# Altium footprint library Footprints.PcbLib: 104 footprints (part 1 of 7)
Each footprint in its own frame and in the unit in brackets; x right, y up, seen from the top. Pads: shape width x height; smd on the part's side, far side on the other; paste and mask are expansions set on the pad; w line width, h text height; cw(c..) or ccw(c..) is an arc to the next point about the centre after c.
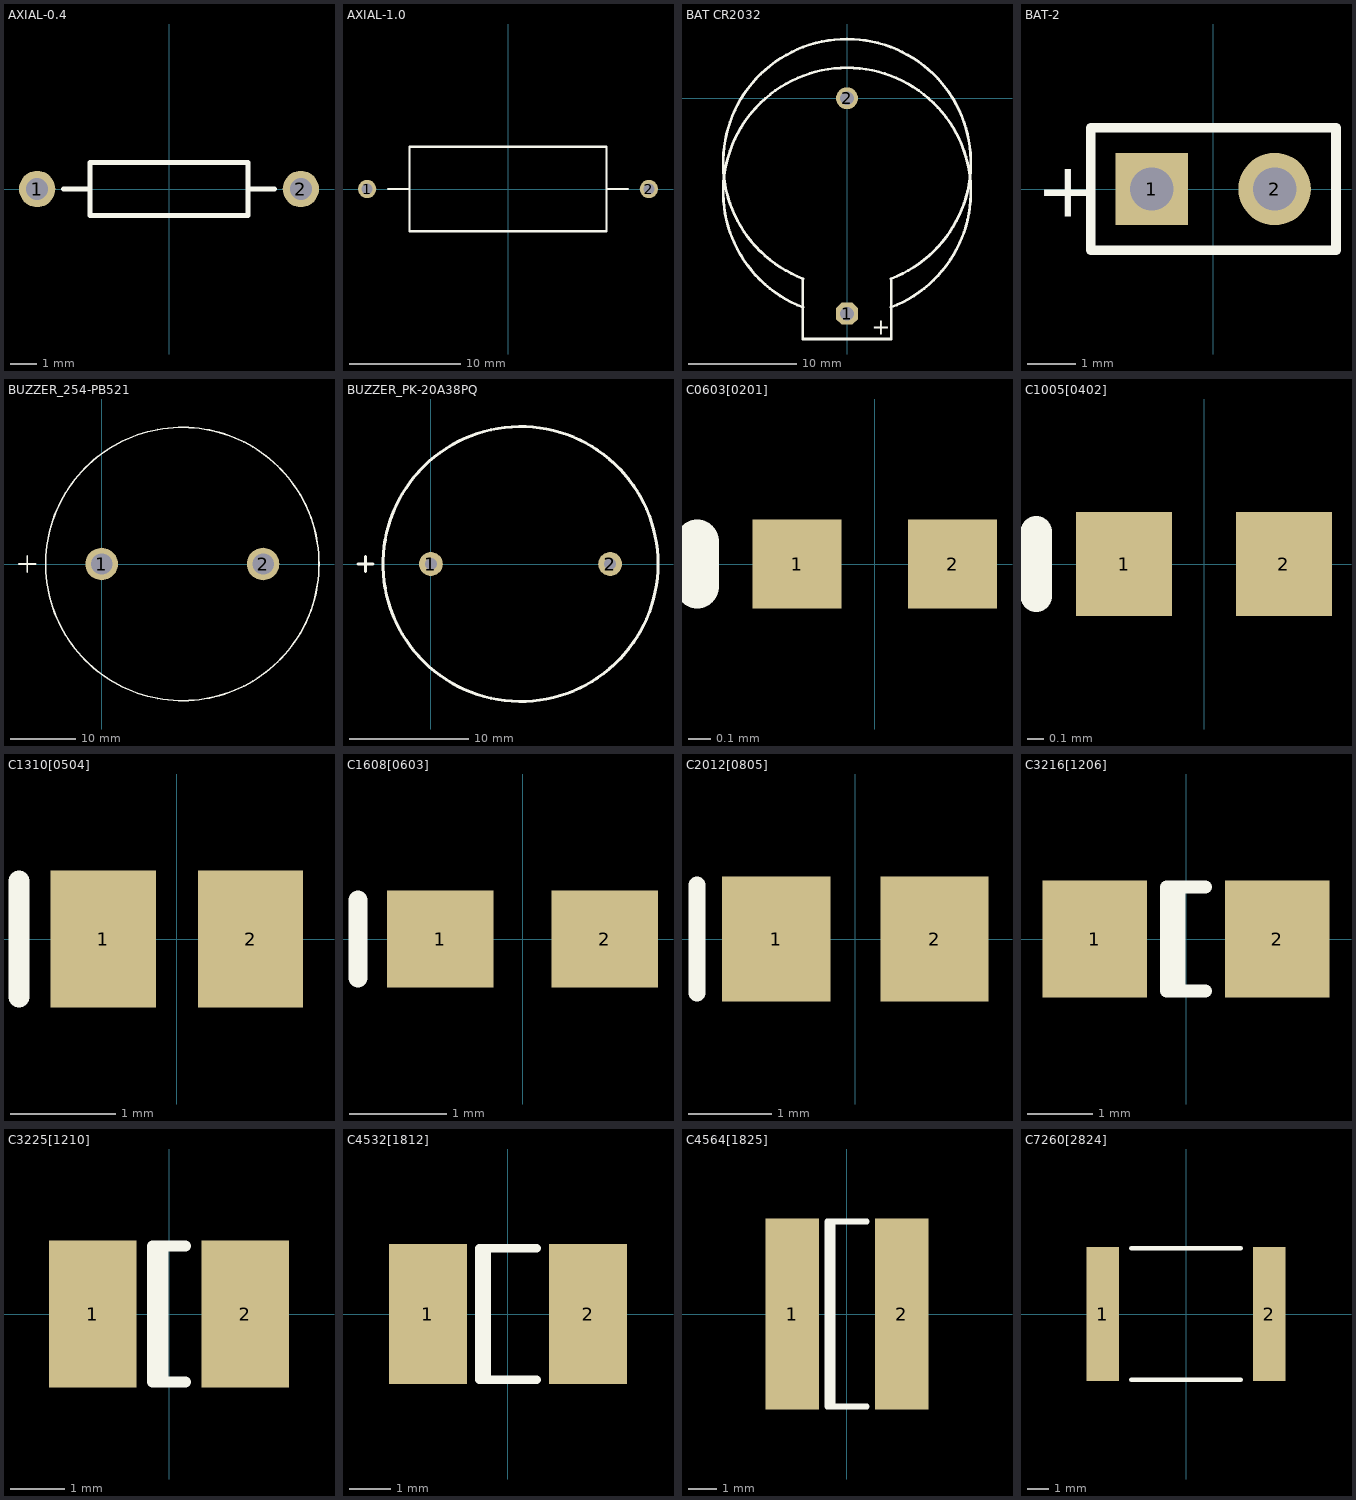
[diagram p0: the footprints below, top view; thin cyan lines are the x and y axes]

## AXIAL-0.4 [mm]
height 2.032
pads (2):
  round 1.4 hole 0.85: 1(-5.08,0) 2(5.08,0)
Top Overlay:
  lines w0.2: -4.064,0 -3.048,0 ; 3.048,0 4.064,0 ; -3.048,-1.016 3.048,-1.016 3.048,1.016 -3.048,1.016 -3.048,-1.016
3D body "RESISTOR 0,25W 0.4 IN LEAD PITCH.step": height 2.85, standoff -2.63, extent -5.385,-1.2 5.385,1.111

## AXIAL-1.0 [mm] "Axial Device, Thru-Hole; 2 Leads; 1.0 in Pin Spacing"
height 7.62
pads (2):
  round 1.65 hole 1: 1(-12.7,0) 2(12.7,0)
Top Overlay:
  lines w0.2: -10.795,0 -8.89,0 ; 8.89,0 10.795,0 ; -8.89,-3.81 8.89,-3.81 8.89,3.81 -8.89,3.81 -8.89,-3.81

## BAT CR2032 [mil] "Bateria Lithium 3V CR2032"
pads (2):
  oct 80x80 hole 50: 1(0,-787.4)
  round 80 hole 50: 2(0,0)
Top Overlay:
  lines w10: -161.42,-659.79 -161.42,-880 161.42,-880 161.42,-660.41 ; -161.23,-764.3 cw(c0,-341.22) 161.03,-764.37 ; -161.23,-659.3 cw(c0,-236.22) 161.03,-659.37
  text "+" at 90,-865 h60
3D body "User Library-Battery Holder CR 2032-2.STEP": height 277.56, standoff -137.8, extent -439.95,-914.37 455.71,215.55

## BAT-2 [mm]
pads (2):
  rect 1.5x1.5 hole 0.9: 1(-1.27,0)
  round 1.5 hole 0.9: 2(1.27,0)
Top Overlay:
  lines w0.2: -2.54,-1.27 -2.54,1.27 2.54,1.27 2.54,-1.27 -2.54,-1.27
  text "+" at -3.67,-0.577 h1.15

## BUZZER_254-PB521 [mm] "PCB Buzzer 2.8 kHz 100dB"
height 16.5
pads (2):
  round 5 hole 3.3: 1(0,0) 2(24.8,0)
Top Overlay:
  circle w0.254: c12.4,0 r21
  lines w0.254: -12.7,0 -10.16,0 ; -11.43,-1.27 -11.43,1.27

## BUZZER_PK-20A38PQ [mm] "PCB Buzzer 3 a 24V 95dB @ 12V"
height 18
pads (2):
  round 2 hole 1: 1(0,0) 2(15,0)
Top Overlay:
  circle w0.254: c7.5,0 r11.5
  lines w0.254: -6.096,0 -4.826,0 ; -5.461,-0.635 -5.461,0.635

## C0603[0201] [mm] "Chip Capacitor; Body 0.6 x 0.3 mm (LxW typ)"
height 0.6
pads (2):
  rect 0.4x0.4 smd: 1(-0.35,0) 2(0.35,0)
Top Overlay:
  lines w0.2: -0.8,-0.1 -0.8,0.1
3D body "0201 SMD Capacitor.step": height 0.3, standoff -0.01, extent -0.44,-0.15 0.44,0.15

## C1005[0402] [mm] "Chip Capacitor; Body 1.0 x 0.5 mm (LxW typ)"
height 0.6
pads (2):
  rect 0.6x0.65 smd: 1(-0.5,0) 2(0.5,0)
Top Overlay:
  lines w0.2: -1.05,-0.2 -1.05,0.2
3D body "0402 SMD Capacitor.STEP": height 0.2, standoff 0, extent -0.5,-0.3 0.5,0.3

## C1310[0504] [mm] "Chip Capacitor; Body 1.2 x 1.0 mm (LxW typ)"
height 1.02
pads (2):
  rect 1x1.3 smd: 1(-0.7,0) 2(0.7,0)
Top Overlay:
  lines w0.2: -1.5,-0.55 -1.5,0.55

## C1608[0603] [mm] "Chip Capacitor; Body 1.6 x 0.8 mm (LxW typ)"
height 0.85
pads (2):
  rect 1.1x1 smd: 1(-0.85,0) 2(0.85,0)
Top Overlay:
  lines w0.2: -1.7,-0.4 -1.7,0.4
3D body "0603 SMD Capacitor.STEP": height 0.3, standoff 0, extent -0.8,-0.4 0.8,0.4

## C2012[0805] [mm] "Chip Capacitor; Body 2.0 x 1.2 mm (LxW typ)"
height 1.1
pads (2):
  rect 1.3x1.5 smd: 1(-0.95,0) 2(0.95,0)
Top Overlay:
  lines w0.2: -1.9,-0.65 -1.9,0.65
3D body "0805 SMD Capacitor.STEP": height 0.8, standoff 0.02, extent -1,-0.625 1,0.625

## C3216[1206] [mm] "Chip Capacitor; Body 3.2 x 1.6 mm (LxW typ)"
height 1.35
pads (2):
  rect 1.6x1.8 smd: 1(-1.4,0) 2(1.4,0)
Top Overlay:
  lines w0.2: -0.11,-0.8 -0.11,0.8 ; 0.3,-0.8 -0.3,-0.8 -0.3,0.8 0.3,0.8
3D body "1206 SMD Capacitor.STEP": height 1.02, standoff 0.02, extent -1.599,-0.781 1.601,0.819

## C3225[1210] [mm] "Chip Capacitor; Body 3.2 x 2.5 mm (LxW typ)"
height 1.35
pads (2):
  rect 1.6x2.7 smd: 1(-1.4,0) 2(1.4,0)
Top Overlay:
  lines w0.2: -0.11,-1.25 -0.11,1.25 ; 0.3,-1.25 -0.3,-1.25 -0.3,1.25 0.3,1.25
3D body "1210 SMD Capacitor.step": height 1.7, standoff 0, extent -2,-1.244 2,1.245

## C4532[1812] [mm] "Chip Capacitor; Body 4.5 x 3.2 mm (LxW typ)"
height 1.35
pads (2):
  rect 1.9x3.4 smd: 1(-1.95,0) 2(1.95,0)
Top Overlay:
  lines w0.2: -0.51,-1.6 -0.51,1.6 ; 0.7,-1.6 -0.7,-1.6 -0.7,1.6 0.7,1.6

## C4564[1825] [mm] "Chip Capacitor; Body 4.5 x 6.4 mm (LxW typ)"
height 1.1
pads (2):
  rect 1.9x6.8 smd: 1(-1.95,0) 2(1.95,0)
Top Overlay:
  lines w0.2: -0.51,-3.3 -0.51,3.3 ; 0.7,-3.3 -0.7,-3.3 -0.7,3.3 0.7,3.3

## C7260[2824] [mm] "EIA2824"
height 4.5
pads (2):
  rect 1.5x6.1 smd: 1(-3.8,0) 2(3.8,0)
Top Overlay:
  lines w0.2: -2.5,-3 2.5,-3 ; -2.5,3 2.5,3
3D body: height 4.5, standoff 0, extent -3.65,-3 3.65,3